# Altium footprint library con-samtec.PCBLIB: 805 footprints (part 39 of 55) (continued)
## TSW-127-02-S-Q [mm]
pads (54):
  oct 1.5x1.5 hole 1: 1(33.02,-2.54) 2(33.02,2.54) 3(30.48,-2.54) 4(30.48,2.54) 5(27.94,-2.54) 6(27.94,2.54) 7(25.4,-2.54) 8(25.4,2.54) 9(22.86,-2.54) 10(22.86,2.54) 11(20.32,-2.54) 12(20.32,2.54) 13(17.78,-2.54) 14(17.78,2.54) 15(15.24,-2.54) 16(15.24,2.54) 17(12.7,-2.54) 18(12.7,2.54) 19(10.16,-2.54) 20(10.16,2.54) 21(7.62,-2.54) 22(7.62,2.54) 23(5.08,-2.54) 24(5.08,2.54) 25(2.54,-2.54) 26(2.54,2.54) 27(0,-2.54) 28(0,2.54) 29(-2.54,-2.54) 30(-2.54,2.54) 31(-5.08,-2.54) 32(-5.08,2.54) 33(-7.62,-2.54) 34(-7.62,2.54) 35(-10.16,-2.54) 36(-10.16,2.54) 37(-12.7,-2.54) 38(-12.7,2.54) 39(-15.24,-2.54) 40(-15.24,2.54) 41(-17.78,-2.54) 42(-17.78,2.54) 43(-20.32,-2.54) 44(-20.32,2.54) 45(-22.86,-2.54) 46(-22.86,2.54) 47(-25.4,-2.54) 48(-25.4,2.54) 49(-27.94,-2.54) 50(-27.94,2.54) 51(-30.48,-2.54) 52(-30.48,2.54) 53(-33.02,-2.54) 54(-33.02,2.54)
Top Overlay:
  lines w0.203: -34.419,-3.695 34.419,-3.695 34.419,3.695 -34.419,3.695 -34.419,-3.695
  text "1" at 32.862,-5.138 h0.94
  text "2" at 32.762,3.989 h0.94
Mechanical 16:
  rectangle: -33.37,-2.89 -32.67,-2.19
  rectangle: -33.37,2.19 -32.67,2.89
  rectangle: -30.83,-2.89 -30.13,-2.19
  rectangle: -30.83,2.19 -30.13,2.89
  rectangle: -28.29,-2.89 -27.59,-2.19
  rectangle: -28.29,2.19 -27.59,2.89
  rectangle: -25.75,-2.89 -25.05,-2.19
  rectangle: -25.75,2.19 -25.05,2.89
  rectangle: -23.21,-2.89 -22.51,-2.19
  rectangle: -23.21,2.19 -22.51,2.89
  rectangle: -20.67,-2.89 -19.97,-2.19
  rectangle: -20.67,2.19 -19.97,2.89
  rectangle: -18.13,-2.89 -17.43,-2.19
  rectangle: -18.13,2.19 -17.43,2.89
  rectangle: -15.59,-2.89 -14.89,-2.19
  rectangle: -15.59,2.19 -14.89,2.89
  rectangle: -13.05,-2.89 -12.35,-2.19
  rectangle: -13.05,2.19 -12.35,2.89
  rectangle: -10.51,-2.89 -9.81,-2.19
  rectangle: -10.51,2.19 -9.81,2.89
  rectangle: -7.97,-2.89 -7.27,-2.19
  rectangle: -7.97,2.19 -7.27,2.89
  rectangle: -5.43,-2.89 -4.73,-2.19
  rectangle: -5.43,2.19 -4.73,2.89
  rectangle: -2.89,-2.89 -2.19,-2.19
  rectangle: -2.89,2.19 -2.19,2.89
  rectangle: -0.35,-2.89 0.35,-2.19
  rectangle: -0.35,2.19 0.35,2.89
  rectangle: 2.19,-2.89 2.89,-2.19
  rectangle: 2.19,2.19 2.89,2.89
  rectangle: 4.73,-2.89 5.43,-2.19
  rectangle: 4.73,2.19 5.43,2.89
  rectangle: 7.27,-2.89 7.97,-2.19
  rectangle: 7.27,2.19 7.97,2.89
  rectangle: 9.81,-2.89 10.51,-2.19
  rectangle: 9.81,2.19 10.51,2.89
  rectangle: 12.35,-2.89 13.05,-2.19
  rectangle: 12.35,2.19 13.05,2.89
  rectangle: 14.89,-2.89 15.59,-2.19
  rectangle: 14.89,2.19 15.59,2.89
  rectangle: 17.43,-2.89 18.13,-2.19
  rectangle: 17.43,2.19 18.13,2.89
  rectangle: 19.97,-2.89 20.67,-2.19
  rectangle: 19.97,2.19 20.67,2.89
  rectangle: 22.51,-2.89 23.21,-2.19
  rectangle: 22.51,2.19 23.21,2.89
  rectangle: 25.05,-2.89 25.75,-2.19
  rectangle: 25.05,2.19 25.75,2.89
  rectangle: 27.59,-2.89 28.29,-2.19
  rectangle: 27.59,2.19 28.29,2.89
  rectangle: 30.13,-2.89 30.83,-2.19
  rectangle: 30.13,2.19 30.83,2.89
  rectangle: 32.67,-2.89 33.37,-2.19
  rectangle: 32.67,2.19 33.37,2.89

## TSW-127-02-S-Q-RA [mil]
pads (54):
  oct 59.06x59.06 hole 39.37: 1(1300,60) 2(1300,260) 3(1200,60) 4(1200,260) 5(1100,60) 6(1100,260) 7(1000,60) 8(1000,260) 9(900,60) 10(900,260) 11(800,60) 12(800,260) 13(700,60) 14(700,260) 15(600,60) 16(600,260) 17(500,60) 18(500,260) 19(400,60) 20(400,260) 21(300,60) 22(300,260) 23(200,60) 24(200,260) 25(100,60) 26(100,260) 27(0,60) 28(0,260) 29(-100,60) 30(-100,260) 31(-200,60) 32(-200,260) 33(-300,60) 34(-300,260) 35(-400,60) 36(-400,260) 37(-500,60) 38(-500,260) 39(-600,60) 40(-600,260) 41(-700,60) 42(-700,260) 43(-800,60) 44(-800,260) 45(-900,60) 46(-900,260) 47(-1000,60) 48(-1000,260) 49(-1100,60) 50(-1100,260) 51(-1200,60) 52(-1200,260) 53(-1300,60) 54(-1300,260)
Top Overlay:
  rectangle: -1310,-310.63 -1290,-80.32
  rectangle: -1210,-310.63 -1190,-80.32
  rectangle: -1110,-310.63 -1090,-80.32
  rectangle: -1010,-310.63 -990,-80.32
  rectangle: -910,-310.63 -890,-80.32
  rectangle: -810,-310.63 -790,-80.32
  rectangle: -710,-310.63 -690,-80.32
  rectangle: -610,-310.63 -590,-80.32
  rectangle: -510,-310.63 -490,-80.32
  rectangle: -410,-310.63 -390,-80.32
  rectangle: -310,-310.63 -290,-80.32
  rectangle: -210,-310.63 -190,-80.32
  rectangle: -110,-310.63 -90,-80.32
  rectangle: -10,-310.63 10,-80.32
  rectangle: 90,-310.63 110,-80.32
  rectangle: 190,-310.63 210,-80.32
  rectangle: 290,-310.63 310,-80.32
  rectangle: 390,-310.63 410,-80.32
  rectangle: 490,-310.63 510,-80.32
  rectangle: 590,-310.63 610,-80.32
  rectangle: 690,-310.63 710,-80.32
  rectangle: 790,-310.63 810,-80.32
  rectangle: 890,-310.63 910,-80.32
  rectangle: 990,-310.63 1010,-80.32
  rectangle: 1090,-310.63 1110,-80.32
  rectangle: 1190,-310.63 1210,-80.32
  rectangle: 1290,-310.63 1310,-80.32
  lines w8: -1355.08,-80.55 1355.08,-80.55 1355.08,-4.17 -1355.08,-4.17 -1355.08,-80.55
  text "1" at 1353.54,43.31 h36.81
  text "2" at 1351.18,242.72 h36.81
Mechanical 16:
  rectangle: -1310,0 -1290,270
  rectangle: -1210,0 -1190,270
  rectangle: -1110,0 -1090,270
  rectangle: -1010,0 -990,270
  rectangle: -910,0 -890,270
  rectangle: -810,0 -790,270
  rectangle: -710,0 -690,270
  rectangle: -610,0 -590,270
  rectangle: -510,0 -490,270
  rectangle: -410,0 -390,270
  rectangle: -310,0 -290,270
  rectangle: -210,0 -190,270
  rectangle: -110,0 -90,270
  rectangle: -10,0 10,270
  rectangle: 90,0 110,270
  rectangle: 190,0 210,270
  rectangle: 290,0 310,270
  rectangle: 390,0 410,270
  rectangle: 490,0 510,270
  rectangle: 590,0 610,270
  rectangle: 690,0 710,270
  rectangle: 790,0 810,270
  rectangle: 890,0 910,270
  rectangle: 990,0 1010,270
  rectangle: 1090,0 1110,270
  rectangle: 1190,0 1210,270
  rectangle: 1290,0 1310,270

## TSW-127-02-S-S [mm]
pads (27):
  oct 1.5x1.5 hole 1: 1(33.02,0) 2(30.48,0) 3(27.94,0) 4(25.4,0) 5(22.86,0) 6(20.32,0) 7(17.78,0) 8(15.24,0) 9(12.7,0) 10(10.16,0) 11(7.62,0) 12(5.08,0) 13(2.54,0) 14(0,0) 15(-2.54,0) 16(-5.08,0) 17(-7.62,0) 18(-10.16,0) 19(-12.7,0) 20(-15.24,0) 21(-17.78,0) 22(-20.32,0) 23(-22.86,0) 24(-25.4,0) 25(-27.94,0) 26(-30.48,0) 27(-33.02,0)
Top Overlay:
  lines w0.203: -34.419,-1.155 34.419,-1.155 34.419,1.155 -34.419,1.155 -34.419,-1.155
  text "1" at 32.762,-2.498 h0.94
Mechanical 16:
  rectangle: -33.37,-0.35 -32.67,0.35
  rectangle: -30.83,-0.35 -30.13,0.35
  rectangle: -28.29,-0.35 -27.59,0.35
  rectangle: -25.75,-0.35 -25.05,0.35
  rectangle: -23.21,-0.35 -22.51,0.35
  rectangle: -20.67,-0.35 -19.97,0.35
  rectangle: -18.13,-0.35 -17.43,0.35
  rectangle: -15.59,-0.35 -14.89,0.35
  rectangle: -13.05,-0.35 -12.35,0.35
  rectangle: -10.51,-0.35 -9.81,0.35
  rectangle: -7.97,-0.35 -7.27,0.35
  rectangle: -5.43,-0.35 -4.73,0.35
  rectangle: -2.89,-0.35 -2.19,0.35
  rectangle: -0.35,-0.35 0.35,0.35
  rectangle: 2.19,-0.35 2.89,0.35
  rectangle: 4.73,-0.35 5.43,0.35
  rectangle: 7.27,-0.35 7.97,0.35
  rectangle: 9.81,-0.35 10.51,0.35
  rectangle: 12.35,-0.35 13.05,0.35
  rectangle: 14.89,-0.35 15.59,0.35
  rectangle: 17.43,-0.35 18.13,0.35
  rectangle: 19.97,-0.35 20.67,0.35
  rectangle: 22.51,-0.35 23.21,0.35
  rectangle: 25.05,-0.35 25.75,0.35
  rectangle: 27.59,-0.35 28.29,0.35
  rectangle: 30.13,-0.35 30.83,0.35
  rectangle: 32.67,-0.35 33.37,0.35

## TSW-127-02-S-S-RA [mil]
pads (27):
  oct 59.06x59.06 hole 39.37: 1(1300,60) 2(1200,60) 3(1100,60) 4(1000,60) 5(900,60) 6(800,60) 7(700,60) 8(600,60) 9(500,60) 10(400,60) 11(300,60) 12(200,60) 13(100,60) 14(0,60) 15(-100,60) 16(-200,60) 17(-300,60) 18(-400,60) 19(-500,60) 20(-600,60) 21(-700,60) 22(-800,60) 23(-900,60) 24(-1000,60) 25(-1100,60) 26(-1200,60) 27(-1300,60)
Top Overlay:
  rectangle: -1310,-310.63 -1290,-80.32
  rectangle: -1210,-310.63 -1190,-80.32
  rectangle: -1110,-310.63 -1090,-80.32
  rectangle: -1010,-310.63 -990,-80.32
  rectangle: -910,-310.63 -890,-80.32
  rectangle: -810,-310.63 -790,-80.32
  rectangle: -710,-310.63 -690,-80.32
  rectangle: -610,-310.63 -590,-80.32
  rectangle: -510,-310.63 -490,-80.32
  rectangle: -410,-310.63 -390,-80.32
  rectangle: -310,-310.63 -290,-80.32
  rectangle: -210,-310.63 -190,-80.32
  rectangle: -110,-310.63 -90,-80.32
  rectangle: -10,-310.63 10,-80.32
  rectangle: 90,-310.63 110,-80.32
  rectangle: 190,-310.63 210,-80.32
  rectangle: 290,-310.63 310,-80.32
  rectangle: 390,-310.63 410,-80.32
  rectangle: 490,-310.63 510,-80.32
  rectangle: 590,-310.63 610,-80.32
  rectangle: 690,-310.63 710,-80.32
  rectangle: 790,-310.63 810,-80.32
  rectangle: 890,-310.63 910,-80.32
  rectangle: 990,-310.63 1010,-80.32
  rectangle: 1090,-310.63 1110,-80.32
  rectangle: 1190,-310.63 1210,-80.32
  rectangle: 1290,-310.63 1310,-80.32
  lines w8: -1355.08,-80.55 1355.08,-80.55 1355.08,-4.17 -1355.08,-4.17 -1355.08,-80.55
  text "1" at 1350.47,45.35 h36.81
Mechanical 16:
  rectangle: -1310,0 -1290,70
  rectangle: -1210,0 -1190,70
  rectangle: -1110,0 -1090,70
  rectangle: -1010,0 -990,70
  rectangle: -910,0 -890,70
  rectangle: -810,0 -790,70
  rectangle: -710,0 -690,70
  rectangle: -610,0 -590,70
  rectangle: -510,0 -490,70
  rectangle: -410,0 -390,70
  rectangle: -310,0 -290,70
  rectangle: -210,0 -190,70
  rectangle: -110,0 -90,70
  rectangle: -10,0 10,70
  rectangle: 90,0 110,70
  rectangle: 190,0 210,70
  rectangle: 290,0 310,70
  rectangle: 390,0 410,70
  rectangle: 490,0 510,70
  rectangle: 590,0 610,70
  rectangle: 690,0 710,70
  rectangle: 790,0 810,70
  rectangle: 890,0 910,70
  rectangle: 990,0 1010,70
  rectangle: 1090,0 1110,70
  rectangle: 1190,0 1210,70
  rectangle: 1290,0 1310,70

## TSW-127-02-S-T [mm]
pads (81):
  oct 1.5x1.5 hole 1: 1(33.02,-2.54) 2(33.02,0) 3(33.02,2.54) 4(30.48,-2.54) 5(30.48,0) 6(30.48,2.54) 7(27.94,-2.54) 8(27.94,0) 9(27.94,2.54) 10(25.4,-2.54) 11(25.4,0) 12(25.4,2.54) 13(22.86,-2.54) 14(22.86,0) 15(22.86,2.54) 16(20.32,-2.54) 17(20.32,0) 18(20.32,2.54) 19(17.78,-2.54) 20(17.78,0) 21(17.78,2.54) 22(15.24,-2.54) 23(15.24,0) 24(15.24,2.54) 25(12.7,-2.54) 26(12.7,0) 27(12.7,2.54) 28(10.16,-2.54) 29(10.16,0) 30(10.16,2.54) 31(7.62,-2.54) 32(7.62,0) 33(7.62,2.54) 34(5.08,-2.54) 35(5.08,0) 36(5.08,2.54) 37(2.54,-2.54) 38(2.54,0) 39(2.54,2.54) 40(0,-2.54) 41(0,0) 42(0,2.54) 43(-2.54,-2.54) 44(-2.54,0) 45(-2.54,2.54) 46(-5.08,-2.54) 47(-5.08,0) 48(-5.08,2.54) 49(-7.62,-2.54) 50(-7.62,0) 51(-7.62,2.54) 52(-10.16,-2.54) 53(-10.16,0) 54(-10.16,2.54) 55(-12.7,-2.54) 56(-12.7,0) 57(-12.7,2.54) 58(-15.24,-2.54) 59(-15.24,0) 60(-15.24,2.54) 61(-17.78,-2.54) 62(-17.78,0) 63(-17.78,2.54) 64(-20.32,-2.54) 65(-20.32,0) 66(-20.32,2.54) 67(-22.86,-2.54) 68(-22.86,0) 69(-22.86,2.54) 70(-25.4,-2.54) 71(-25.4,0) 72(-25.4,2.54) 73(-27.94,-2.54) 74(-27.94,0) 75(-27.94,2.54) 76(-30.48,-2.54) 77(-30.48,0) 78(-30.48,2.54) 79(-33.02,-2.54) 80(-33.02,0) 81(-33.02,2.54)
Top Overlay:
  lines w0.203: -34.419,-3.695 34.419,-3.695 34.419,3.695 -34.419,3.695 -34.419,-3.695
  text "1" at 32.712,-5.188 h0.94
  text "3" at 32.708,3.989 h0.94
Mechanical 16:
  rectangle: -33.37,-2.89 -32.67,-2.19
  rectangle: -33.37,-0.35 -32.67,0.35
  rectangle: -33.37,2.19 -32.67,2.89
  rectangle: -30.83,-2.89 -30.13,-2.19
  rectangle: -30.83,-0.35 -30.13,0.35
  rectangle: -30.83,2.19 -30.13,2.89
  rectangle: -28.29,-2.89 -27.59,-2.19
  rectangle: -28.29,-0.35 -27.59,0.35
  rectangle: -28.29,2.19 -27.59,2.89
  rectangle: -25.75,-2.89 -25.05,-2.19
  rectangle: -25.75,-0.35 -25.05,0.35
  rectangle: -25.75,2.19 -25.05,2.89
  rectangle: -23.21,-2.89 -22.51,-2.19
  rectangle: -23.21,-0.35 -22.51,0.35
  rectangle: -23.21,2.19 -22.51,2.89
  rectangle: -20.67,-2.89 -19.97,-2.19
  rectangle: -20.67,-0.35 -19.97,0.35
  rectangle: -20.67,2.19 -19.97,2.89
  rectangle: -18.13,-2.89 -17.43,-2.19
  rectangle: -18.13,-0.35 -17.43,0.35
  rectangle: -18.13,2.19 -17.43,2.89
  rectangle: -15.59,-2.89 -14.89,-2.19
  rectangle: -15.59,-0.35 -14.89,0.35
  rectangle: -15.59,2.19 -14.89,2.89
  rectangle: -13.05,-2.89 -12.35,-2.19
  rectangle: -13.05,-0.35 -12.35,0.35
  rectangle: -13.05,2.19 -12.35,2.89
  rectangle: -10.51,-2.89 -9.81,-2.19
  rectangle: -10.51,-0.35 -9.81,0.35
  rectangle: -10.51,2.19 -9.81,2.89
  rectangle: -7.97,-2.89 -7.27,-2.19
  rectangle: -7.97,-0.35 -7.27,0.35
  rectangle: -7.97,2.19 -7.27,2.89
  rectangle: -5.43,-2.89 -4.73,-2.19
  rectangle: -5.43,-0.35 -4.73,0.35
  rectangle: -5.43,2.19 -4.73,2.89
  rectangle: -2.89,-2.89 -2.19,-2.19
  rectangle: -2.89,-0.35 -2.19,0.35
  rectangle: -2.89,2.19 -2.19,2.89
  rectangle: -0.35,-2.89 0.35,-2.19
  rectangle: -0.35,-0.35 0.35,0.35
  rectangle: -0.35,2.19 0.35,2.89
  rectangle: 2.19,-2.89 2.89,-2.19
  rectangle: 2.19,-0.35 2.89,0.35
  rectangle: 2.19,2.19 2.89,2.89
  rectangle: 4.73,-2.89 5.43,-2.19
  rectangle: 4.73,-0.35 5.43,0.35
  rectangle: 4.73,2.19 5.43,2.89
  rectangle: 7.27,-2.89 7.97,-2.19
  rectangle: 7.27,-0.35 7.97,0.35
  rectangle: 7.27,2.19 7.97,2.89
  rectangle: 9.81,-2.89 10.51,-2.19
  rectangle: 9.81,-0.35 10.51,0.35
  rectangle: 9.81,2.19 10.51,2.89
  rectangle: 12.35,-2.89 13.05,-2.19
  rectangle: 12.35,-0.35 13.05,0.35
  rectangle: 12.35,2.19 13.05,2.89
  rectangle: 14.89,-2.89 15.59,-2.19
  rectangle: 14.89,-0.35 15.59,0.35
  rectangle: 14.89,2.19 15.59,2.89
  rectangle: 17.43,-2.89 18.13,-2.19
  rectangle: 17.43,-0.35 18.13,0.35
  rectangle: 17.43,2.19 18.13,2.89
  rectangle: 19.97,-2.89 20.67,-2.19
  rectangle: 19.97,-0.35 20.67,0.35
  rectangle: 19.97,2.19 20.67,2.89
  rectangle: 22.51,-2.89 23.21,-2.19
  rectangle: 22.51,-0.35 23.21,0.35
  rectangle: 22.51,2.19 23.21,2.89
  rectangle: 25.05,-2.89 25.75,-2.19
  rectangle: 25.05,-0.35 25.75,0.35
  rectangle: 25.05,2.19 25.75,2.89
  rectangle: 27.59,-2.89 28.29,-2.19
  rectangle: 27.59,-0.35 28.29,0.35
  rectangle: 27.59,2.19 28.29,2.89
  rectangle: 30.13,-2.89 30.83,-2.19
  rectangle: 30.13,-0.35 30.83,0.35
  rectangle: 30.13,2.19 30.83,2.89
  rectangle: 32.67,-2.89 33.37,-2.19
  rectangle: 32.67,-0.35 33.37,0.35
  rectangle: 32.67,2.19 33.37,2.89

## TSW-127-02-S-T-RA [mil]
pads (81):
  oct 59.06x59.06 hole 39.37: 1(1300,60) 2(1300,160) 3(1300,260) 4(1200,60) 5(1200,160) 6(1200,260) 7(1100,60) 8(1100,160) 9(1100,260) 10(1000,60) 11(1000,160) 12(1000,260) 13(900,60) 14(900,160) 15(900,260) 16(800,60) 17(800,160) 18(800,260) 19(700,60) 20(700,160) 21(700,260) 22(600,60) 23(600,160) 24(600,260) 25(500,60) 26(500,160) 27(500,260) 28(400,60) 29(400,160) 30(400,260) 31(300,60) 32(300,160) 33(300,260) 34(200,60) 35(200,160) 36(200,260) 37(100,60) 38(100,160) 39(100,260) 40(0,60) 41(0,160) 42(0,260) 43(-100,60) 44(-100,160) 45(-100,260) 46(-200,60) 47(-200,160) 48(-200,260) 49(-300,60) 50(-300,160) 51(-300,260) 52(-400,60) 53(-400,160) 54(-400,260) 55(-500,60) 56(-500,160) 57(-500,260) 58(-600,60) 59(-600,160) 60(-600,260) 61(-700,60) 62(-700,160) 63(-700,260) 64(-800,60) 65(-800,160) 66(-800,260) 67(-900,60) 68(-900,160) 69(-900,260) 70(-1000,60) 71(-1000,160) 72(-1000,260) 73(-1100,60) 74(-1100,160) 75(-1100,260) 76(-1200,60) 77(-1200,160) 78(-1200,260) 79(-1300,60) 80(-1300,160) 81(-1300,260)
Top Overlay:
  rectangle: -1310,-310.63 -1290,-80.32
  rectangle: -1210,-310.63 -1190,-80.32
  rectangle: -1110,-310.63 -1090,-80.32
  rectangle: -1010,-310.63 -990,-80.32
  rectangle: -910,-310.63 -890,-80.32
  rectangle: -810,-310.63 -790,-80.32
  rectangle: -710,-310.63 -690,-80.32
  rectangle: -610,-310.63 -590,-80.32
  rectangle: -510,-310.63 -490,-80.32
  rectangle: -410,-310.63 -390,-80.32
  rectangle: -310,-310.63 -290,-80.32
  rectangle: -210,-310.63 -190,-80.32
  rectangle: -110,-310.63 -90,-80.32
  rectangle: -10,-310.63 10,-80.32
  rectangle: 90,-310.63 110,-80.32
  rectangle: 190,-310.63 210,-80.32
  rectangle: 290,-310.63 310,-80.32
  rectangle: 390,-310.63 410,-80.32
  rectangle: 490,-310.63 510,-80.32
  rectangle: 590,-310.63 610,-80.32
  rectangle: 690,-310.63 710,-80.32
  rectangle: 790,-310.63 810,-80.32
  rectangle: 890,-310.63 910,-80.32
  rectangle: 990,-310.63 1010,-80.32
  rectangle: 1090,-310.63 1110,-80.32
  rectangle: 1190,-310.63 1210,-80.32
  rectangle: 1290,-310.63 1310,-80.32
  lines w8: -1355.08,-80.55 1355.08,-80.55 1355.08,-4.17 -1355.08,-4.17 -1355.08,-80.55
  text "1" at 1351.57,41.34 h36.81
  text "3" at 1352.17,236.81 h36.81
Mechanical 16:
  rectangle: -1310,0 -1290,270
  rectangle: -1210,0 -1190,270
  rectangle: -1110,0 -1090,270
  rectangle: -1010,0 -990,270
  rectangle: -910,0 -890,270
  rectangle: -810,0 -790,270
  rectangle: -710,0 -690,270
  rectangle: -610,0 -590,270
  rectangle: -510,0 -490,270
  rectangle: -410,0 -390,270
  rectangle: -310,0 -290,270
  rectangle: -210,0 -190,270
  rectangle: -110,0 -90,270
  rectangle: -10,0 10,270
  rectangle: 90,0 110,270
  rectangle: 190,0 210,270
  rectangle: 290,0 310,270
  rectangle: 390,0 410,270
  rectangle: 490,0 510,270
  rectangle: 590,0 610,270
  rectangle: 690,0 710,270
  rectangle: 790,0 810,270
  rectangle: 890,0 910,270
  rectangle: 990,0 1010,270
  rectangle: 1090,0 1110,270
  rectangle: 1190,0 1210,270
  rectangle: 1290,0 1310,270

## TSW-128-02-S-D [mm]
pads (56):
  oct 1.5x1.5 hole 1: 1(34.29,-1.27) 2(34.29,1.27) 3(31.75,-1.27) 4(31.75,1.27) 5(29.21,-1.27) 6(29.21,1.27) 7(26.67,-1.27) 8(26.67,1.27) 9(24.13,-1.27) 10(24.13,1.27) 11(21.59,-1.27) 12(21.59,1.27) 13(19.05,-1.27) 14(19.05,1.27) 15(16.51,-1.27) 16(16.51,1.27) 17(13.97,-1.27) 18(13.97,1.27) 19(11.43,-1.27) 20(11.43,1.27) 21(8.89,-1.27) 22(8.89,1.27) 23(6.35,-1.27) 24(6.35,1.27) 25(3.81,-1.27) 26(3.81,1.27) 27(1.27,-1.27) 28(1.27,1.27) 29(-1.27,-1.27) 30(-1.27,1.27) 31(-3.81,-1.27) 32(-3.81,1.27) 33(-6.35,-1.27) 34(-6.35,1.27) 35(-8.89,-1.27) 36(-8.89,1.27) 37(-11.43,-1.27) 38(-11.43,1.27) 39(-13.97,-1.27) 40(-13.97,1.27) 41(-16.51,-1.27) 42(-16.51,1.27) 43(-19.05,-1.27) 44(-19.05,1.27) 45(-21.59,-1.27) 46(-21.59,1.27) 47(-24.13,-1.27) 48(-24.13,1.27) 49(-26.67,-1.27) 50(-26.67,1.27) 51(-29.21,-1.27) 52(-29.21,1.27) 53(-31.75,-1.27) 54(-31.75,1.27) 55(-34.29,-1.27) 56(-34.29,1.27)
Top Overlay:
  lines w0.203: -35.689,-2.425 35.689,-2.425 35.689,2.425 -35.689,2.425 -35.689,-2.425
  text "1" at 34.082,-3.818 h0.94
  text "2" at 33.907,2.744 h0.94
Mechanical 16:
  rectangle: -34.64,-1.62 -33.94,-0.92
  rectangle: -34.64,0.92 -33.94,1.62
  rectangle: -32.1,-1.62 -31.4,-0.92
  rectangle: -32.1,0.92 -31.4,1.62
  rectangle: -29.56,-1.62 -28.86,-0.92
  rectangle: -29.56,0.92 -28.86,1.62
  rectangle: -27.02,-1.62 -26.32,-0.92
  rectangle: -27.02,0.92 -26.32,1.62
  rectangle: -24.48,-1.62 -23.78,-0.92
  rectangle: -24.48,0.92 -23.78,1.62
  rectangle: -21.94,-1.62 -21.24,-0.92
  rectangle: -21.94,0.92 -21.24,1.62
  rectangle: -19.4,-1.62 -18.7,-0.92
  rectangle: -19.4,0.92 -18.7,1.62
  rectangle: -16.86,-1.62 -16.16,-0.92
  rectangle: -16.86,0.92 -16.16,1.62
  rectangle: -14.32,-1.62 -13.62,-0.92
  rectangle: -14.32,0.92 -13.62,1.62
  rectangle: -11.78,-1.62 -11.08,-0.92
  rectangle: -11.78,0.92 -11.08,1.62
  rectangle: -9.24,-1.62 -8.54,-0.92
  rectangle: -9.24,0.92 -8.54,1.62
  rectangle: -6.7,-1.62 -6,-0.92
  rectangle: -6.7,0.92 -6,1.62
  rectangle: -4.16,-1.62 -3.46,-0.92
  rectangle: -4.16,0.92 -3.46,1.62
  rectangle: -1.62,-1.62 -0.92,-0.92
  rectangle: -1.62,0.92 -0.92,1.62
  rectangle: 0.92,-1.62 1.62,-0.92
  rectangle: 0.92,0.92 1.62,1.62
  rectangle: 3.46,-1.62 4.16,-0.92
  rectangle: 3.46,0.92 4.16,1.62
  rectangle: 6,-1.62 6.7,-0.92
  rectangle: 6,0.92 6.7,1.62
  rectangle: 8.54,-1.62 9.24,-0.92
  rectangle: 8.54,0.92 9.24,1.62
  rectangle: 11.08,-1.62 11.78,-0.92
  rectangle: 11.08,0.92 11.78,1.62
  rectangle: 13.62,-1.62 14.32,-0.92
  rectangle: 13.62,0.92 14.32,1.62
  rectangle: 16.16,-1.62 16.86,-0.92
  rectangle: 16.16,0.92 16.86,1.62
  rectangle: 18.7,-1.62 19.4,-0.92
  rectangle: 18.7,0.92 19.4,1.62
  rectangle: 21.24,-1.62 21.94,-0.92
  rectangle: 21.24,0.92 21.94,1.62
  rectangle: 23.78,-1.62 24.48,-0.92
  rectangle: 23.78,0.92 24.48,1.62
  rectangle: 26.32,-1.62 27.02,-0.92
  rectangle: 26.32,0.92 27.02,1.62
  rectangle: 28.86,-1.62 29.56,-0.92
  rectangle: 28.86,0.92 29.56,1.62
  rectangle: 31.4,-1.62 32.1,-0.92
  rectangle: 31.4,0.92 32.1,1.62
  rectangle: 33.94,-1.62 34.64,-0.92
  rectangle: 33.94,0.92 34.64,1.62

## TSW-128-02-S-D-RA [mil]
pads (56):
  oct 59.06x59.06 hole 39.37: 1(1350,60) 2(1350,160) 3(1250,60) 4(1250,160) 5(1150,60) 6(1150,160) 7(1050,60) 8(1050,160) 9(950,60) 10(950,160) 11(850,60) 12(850,160) 13(750,60) 14(750,160) 15(650,60) 16(650,160) 17(550,60) 18(550,160) 19(450,60) 20(450,160) 21(350,60) 22(350,160) 23(250,60) 24(250,160) 25(150,60) 26(150,160) 27(50,60) 28(50,160) 29(-50,60) 30(-50,160) 31(-150,60) 32(-150,160) 33(-250,60) 34(-250,160) 35(-350,60) 36(-350,160) 37(-450,60) 38(-450,160) 39(-550,60) 40(-550,160) 41(-650,60) 42(-650,160) 43(-750,60) 44(-750,160) 45(-850,60) 46(-850,160) 47(-950,60) 48(-950,160) 49(-1050,60) 50(-1050,160) 51(-1150,60) 52(-1150,160) 53(-1250,60) 54(-1250,160) 55(-1350,60) 56(-1350,160)
Top Overlay:
  rectangle: -1360,-310.63 -1340,-80.32
  rectangle: -1260,-310.63 -1240,-80.32
  rectangle: -1160,-310.63 -1140,-80.32
  rectangle: -1060,-310.63 -1040,-80.32
  rectangle: -960,-310.63 -940,-80.32
  rectangle: -860,-310.63 -840,-80.32
  rectangle: -760,-310.63 -740,-80.32
  rectangle: -660,-310.63 -640,-80.32
  rectangle: -560,-310.63 -540,-80.32
  rectangle: -460,-310.63 -440,-80.32
  rectangle: -360,-310.63 -340,-80.32
  rectangle: -260,-310.63 -240,-80.32
  rectangle: -160,-310.63 -140,-80.32
  rectangle: -60,-310.63 -40,-80.32
  rectangle: 40,-310.63 60,-80.32
  rectangle: 140,-310.63 160,-80.32
  rectangle: 240,-310.63 260,-80.32
  rectangle: 340,-310.63 360,-80.32
  rectangle: 440,-310.63 460,-80.32
  rectangle: 540,-310.63 560,-80.32
  rectangle: 640,-310.63 660,-80.32
  rectangle: 740,-310.63 760,-80.32
  rectangle: 840,-310.63 860,-80.32
  rectangle: 940,-310.63 960,-80.32
  rectangle: 1040,-310.63 1060,-80.32
  rectangle: 1140,-310.63 1160,-80.32
  rectangle: 1240,-310.63 1260,-80.32
  rectangle: 1340,-310.63 1360,-80.32
  lines w8: -1405.08,-80.55 1405.08,-80.55 1405.08,-4.17 -1405.08,-4.17 -1405.08,-80.55
  text "1" at 1400.59,30.51 h36.81
  text "2" at 1399.21,129.53 h36.81
Mechanical 16:
  rectangle: -1360,0 -1340,170
  rectangle: -1260,0 -1240,170
  rectangle: -1160,0 -1140,170
  rectangle: -1060,0 -1040,170
  rectangle: -960,0 -940,170
  rectangle: -860,0 -840,170
  rectangle: -760,0 -740,170
  rectangle: -660,0 -640,170
  rectangle: -560,0 -540,170
  rectangle: -460,0 -440,170
  rectangle: -360,0 -340,170
  rectangle: -260,0 -240,170
  rectangle: -160,0 -140,170
  rectangle: -60,0 -40,170
  rectangle: 40,0 60,170
  rectangle: 140,0 160,170
  rectangle: 240,0 260,170
  rectangle: 340,0 360,170
  rectangle: 440,0 460,170
  rectangle: 540,0 560,170
  rectangle: 640,0 660,170
  rectangle: 740,0 760,170
  rectangle: 840,0 860,170
  rectangle: 940,0 960,170
  rectangle: 1040,0 1060,170
  rectangle: 1140,0 1160,170
  rectangle: 1240,0 1260,170
  rectangle: 1340,0 1360,170

## TSW-128-02-S-Q [mm]
pads (56):
  oct 1.5x1.5 hole 1: 1(34.29,-2.54) 2(34.29,2.54) 3(31.75,-2.54) 4(31.75,2.54) 5(29.21,-2.54) 6(29.21,2.54) 7(26.67,-2.54) 8(26.67,2.54) 9(24.13,-2.54) 10(24.13,2.54) 11(21.59,-2.54) 12(21.59,2.54) 13(19.05,-2.54) 14(19.05,2.54) 15(16.51,-2.54) 16(16.51,2.54) 17(13.97,-2.54) 18(13.97,2.54) 19(11.43,-2.54) 20(11.43,2.54) 21(8.89,-2.54) 22(8.89,2.54) 23(6.35,-2.54) 24(6.35,2.54) 25(3.81,-2.54) 26(3.81,2.54) 27(1.27,-2.54) 28(1.27,2.54) 29(-1.27,-2.54) 30(-1.27,2.54) 31(-3.81,-2.54) 32(-3.81,2.54) 33(-6.35,-2.54) 34(-6.35,2.54) 35(-8.89,-2.54) 36(-8.89,2.54) 37(-11.43,-2.54) 38(-11.43,2.54) 39(-13.97,-2.54) 40(-13.97,2.54) 41(-16.51,-2.54) 42(-16.51,2.54) 43(-19.05,-2.54) 44(-19.05,2.54) 45(-21.59,-2.54) 46(-21.59,2.54) 47(-24.13,-2.54) 48(-24.13,2.54) 49(-26.67,-2.54) 50(-26.67,2.54) 51(-29.21,-2.54) 52(-29.21,2.54) 53(-31.75,-2.54) 54(-31.75,2.54) 55(-34.29,-2.54) 56(-34.29,2.54)
Top Overlay:
  lines w0.203: -35.689,-3.695 35.689,-3.695 35.689,3.695 -35.689,3.695 -35.689,-3.695
  text "1" at 34.132,-5.138 h0.94
  text "2" at 34.032,3.989 h0.94
Mechanical 16:
  rectangle: -34.64,-2.89 -33.94,-2.19
  rectangle: -34.64,2.19 -33.94,2.89
  rectangle: -32.1,-2.89 -31.4,-2.19
  rectangle: -32.1,2.19 -31.4,2.89
  rectangle: -29.56,-2.89 -28.86,-2.19
  rectangle: -29.56,2.19 -28.86,2.89
  rectangle: -27.02,-2.89 -26.32,-2.19
  rectangle: -27.02,2.19 -26.32,2.89
  rectangle: -24.48,-2.89 -23.78,-2.19
  rectangle: -24.48,2.19 -23.78,2.89
  rectangle: -21.94,-2.89 -21.24,-2.19
  rectangle: -21.94,2.19 -21.24,2.89
  rectangle: -19.4,-2.89 -18.7,-2.19
  rectangle: -19.4,2.19 -18.7,2.89
  rectangle: -16.86,-2.89 -16.16,-2.19
  rectangle: -16.86,2.19 -16.16,2.89
  rectangle: -14.32,-2.89 -13.62,-2.19
  rectangle: -14.32,2.19 -13.62,2.89
  rectangle: -11.78,-2.89 -11.08,-2.19
  rectangle: -11.78,2.19 -11.08,2.89
  rectangle: -9.24,-2.89 -8.54,-2.19
  rectangle: -9.24,2.19 -8.54,2.89
  rectangle: -6.7,-2.89 -6,-2.19
  rectangle: -6.7,2.19 -6,2.89
  rectangle: -4.16,-2.89 -3.46,-2.19
  rectangle: -4.16,2.19 -3.46,2.89
  rectangle: -1.62,-2.89 -0.92,-2.19
  rectangle: -1.62,2.19 -0.92,2.89
  rectangle: 0.92,-2.89 1.62,-2.19
  rectangle: 0.92,2.19 1.62,2.89
  rectangle: 3.46,-2.89 4.16,-2.19
  rectangle: 3.46,2.19 4.16,2.89
  rectangle: 6,-2.89 6.7,-2.19
  rectangle: 6,2.19 6.7,2.89
  rectangle: 8.54,-2.89 9.24,-2.19
  rectangle: 8.54,2.19 9.24,2.89
  rectangle: 11.08,-2.89 11.78,-2.19
  rectangle: 11.08,2.19 11.78,2.89
  rectangle: 13.62,-2.89 14.32,-2.19
  rectangle: 13.62,2.19 14.32,2.89
  rectangle: 16.16,-2.89 16.86,-2.19
  rectangle: 16.16,2.19 16.86,2.89
  rectangle: 18.7,-2.89 19.4,-2.19
  rectangle: 18.7,2.19 19.4,2.89
  rectangle: 21.24,-2.89 21.94,-2.19
  rectangle: 21.24,2.19 21.94,2.89
  rectangle: 23.78,-2.89 24.48,-2.19
  rectangle: 23.78,2.19 24.48,2.89
  rectangle: 26.32,-2.89 27.02,-2.19
  rectangle: 26.32,2.19 27.02,2.89
  rectangle: 28.86,-2.89 29.56,-2.19
  rectangle: 28.86,2.19 29.56,2.89
  rectangle: 31.4,-2.89 32.1,-2.19
  rectangle: 31.4,2.19 32.1,2.89
  rectangle: 33.94,-2.89 34.64,-2.19
  rectangle: 33.94,2.19 34.64,2.89